# Altium footprint library PcbLib1.PcbLib: 1009 footprints (part 29 of 64)
Each footprint in its own frame and in the unit in brackets; x right, y up, seen from the top. Pads: shape width x height; smd on the part's side, far side on the other; paste and mask are expansions set on the pad; w line width, h text height; cw(c..) or ccw(c..) is an arc to the next point about the centre after c.
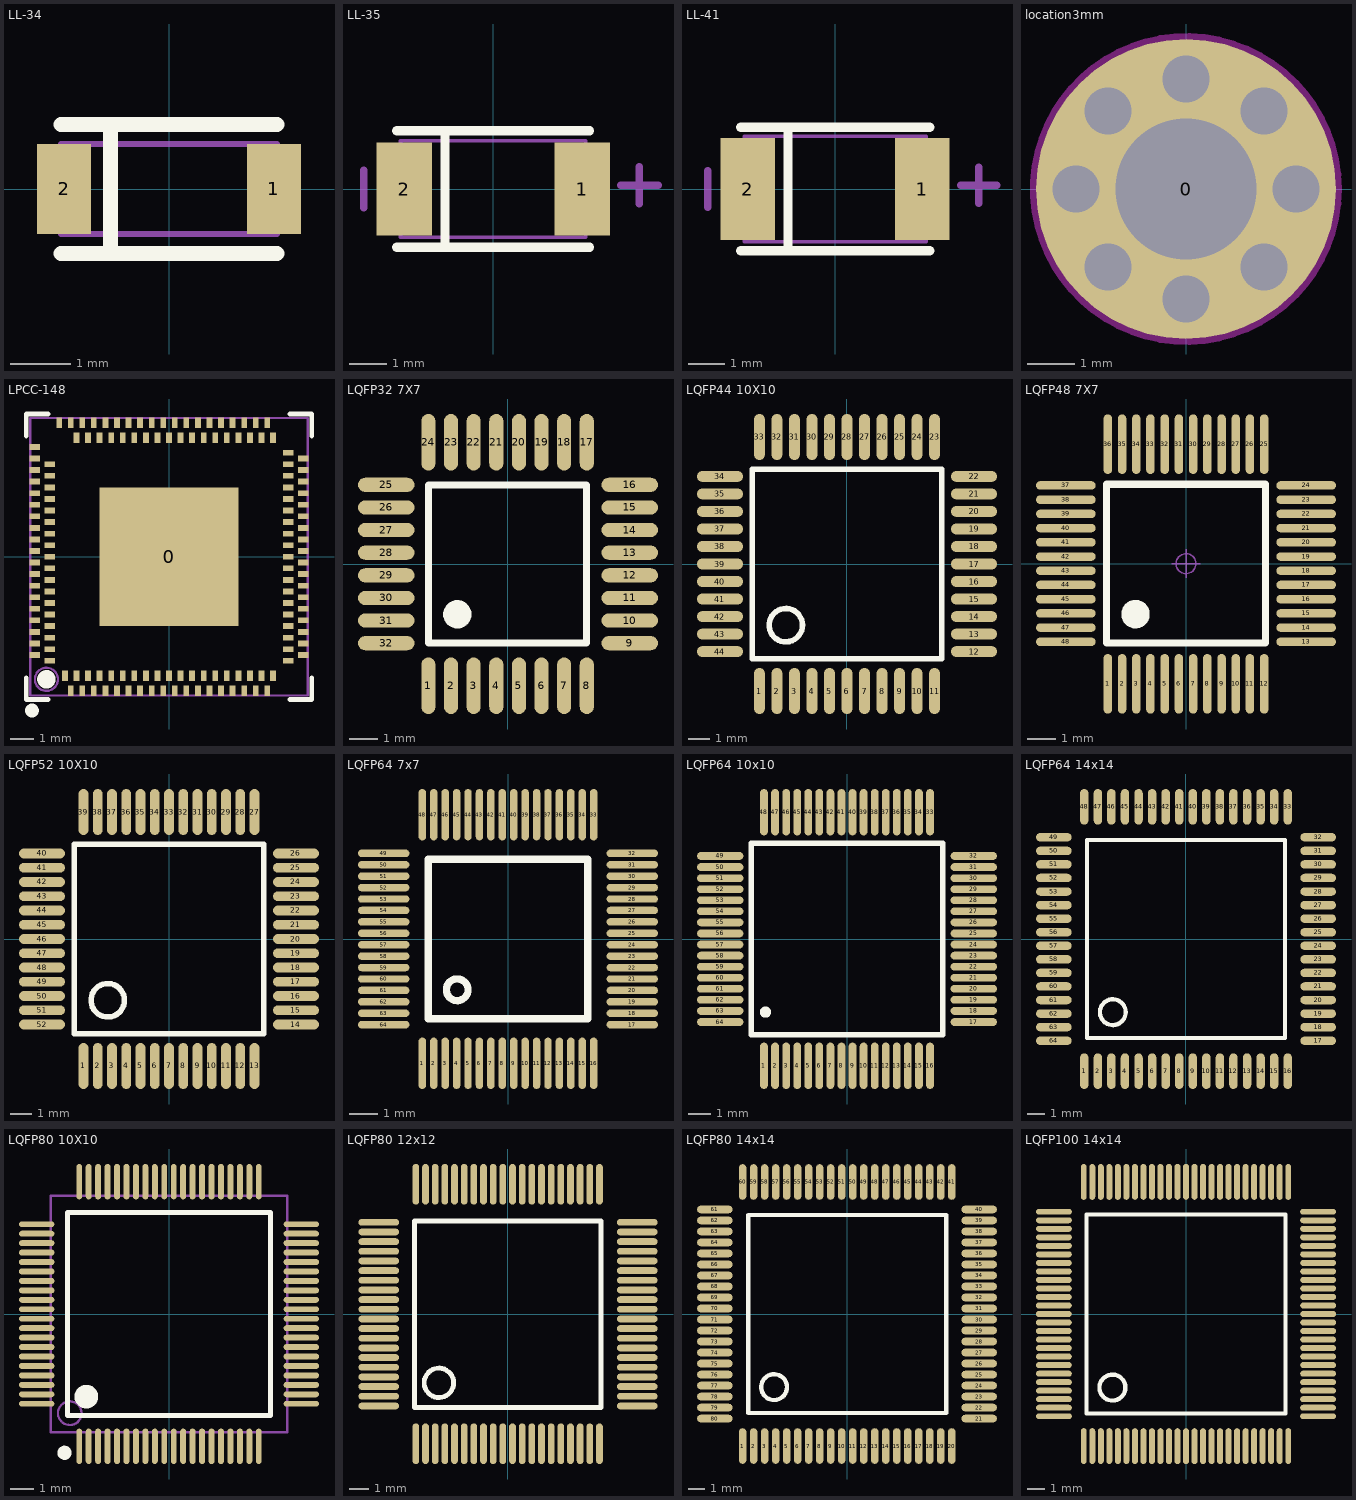
[diagram p28: the footprints below, top view; thin cyan lines are the x and y axes]

## LL-34 [mm]
pads (2):
  rect 0.9x1.5 smd: 1(1.75,0) 2(-1.75,0)
Top Overlay:
  lines w0.254: -1.8,-1.075 1.8,-1.075 ; -1.8,1.075 1.8,1.075 ; -0.975,-1.075 -0.975,1.075
Mechanical 13:
  lines w0.1: -1.8,-0.75 1.8,-0.75 1.8,0.75 -1.8,0.75 -1.8,-0.75
3D body "llds.stp": height 1.5, standoff 0, extent -1.7,-0.754 1.7,0.754

## LL-35 [mm]
pads (2):
  rect 1.5x2.5 smd: 1(2.4,0) 2(-2.4,0)
Top Overlay:
  lines w0.254: -2.6,-1.575 2.6,-1.575 ; -2.6,1.575 2.6,1.575 ; -1.3,-1.575 -1.3,1.575
Mechanical 13:
  lines w0.1: -2.5,-1.3 2.5,-1.3 2.5,1.3 -2.5,1.3 -2.5,-1.3
Mechanical 15:
  lines w0.203: -3.5,-0.5 -3.5,0.5 ; 3.45,0.1 4.45,0.1 ; 3.95,-0.4 3.95,0.6

## LL-41 [mm]
pads (2):
  rect 1.5x2.8 smd: 1(2.4,0) 2(-2.4,0)
Top Overlay:
  lines w0.254: -2.6,-1.7 2.6,-1.7 ; -2.6,1.7 2.6,1.7 ; -1.3,-1.7 -1.3,1.7
Mechanical 13:
  lines w0.1: -2.5,-1.45 -2.5,1.45 2.5,1.45 2.5,-1.45 -2.5,-1.45
Mechanical 15:
  lines w0.203: -3.5,-0.5 -3.5,0.5 ; 3.45,0.1 4.45,0.1 ; 3.95,-0.4 3.95,0.6

## location3mm [mm]
pads (1):
  round 6.4 hole 3: 0(0,0)
via 1.662,1.662 diameter 1 hole 1
via 0,2.35 diameter 1 hole 1
via -1.662,1.662 diameter 1 hole 1
via -2.35,0 diameter 1 hole 1
via -1.662,-1.662 diameter 1 hole 1
via 0,-2.35 diameter 1 hole 1
via 1.662,-1.662 diameter 1 hole 1
via 2.35,0 diameter 1 hole 1
Keep-Out Layer:
  circle w0.254: c0,0 r3.2
Mechanical 1:
  circle w0.1: c1.662,1.662 r0.508

## LPCC-148 [mm]
pads (149):
  rect 6x6 smd: 0(0,0)
  rect 0.25x0.45 smd mask+0.051: A3(-4.25,-5.8) A4(-3.75,-5.8) A5(-3.25,-5.8) A6(-2.75,-5.8) A7(-2.25,-5.8) A8(-1.75,-5.8) A9(-1.25,-5.8) A10(-0.75,-5.8) A11(-0.25,-5.8) A12(0.25,-5.8) A13(0.75,-5.8) A14(1.25,-5.8) A15(1.75,-5.8) A16(2.25,-5.8) A17(2.75,-5.8) A18(3.25,-5.8) A19(3.75,-5.8) A20(4.25,-5.8) A47(4.25,5.8) A48(3.75,5.8) A49(3.25,5.8) A50(2.75,5.8) A51(2.25,5.8) A52(1.75,5.8) A53(1.25,5.8) A54(0.75,5.8) A55(0.25,5.8) A56(-0.25,5.8) A57(-0.75,5.8) A58(-1.25,5.8) A59(-1.75,5.8) A60(-2.25,5.8) A61(-2.75,5.8) A62(-3.25,5.8) A63(-3.75,5.8) A64(-4.25,5.8) A65(-4.75,5.8) B1(-4.5,-5.15) B2(-4,-5.15) B3(-3.5,-5.15) B4(-3,-5.15) B5(-2.5,-5.15) B6(-2,-5.15) B7(-1.5,-5.15) B8(-1,-5.15) B9(-0.5,-5.15) B10(0,-5.15) B11(0.5,-5.15) B12(1,-5.15) B13(1.5,-5.15) B14(2,-5.15) B15(2.5,-5.15) B16(3,-5.15) B17(3.5,-5.15) B18(4,-5.15) B19(4.5,-5.15) B39(4.5,5.15) B40(4,5.15) B41(3.5,5.15) B42(3,5.15) B43(2.5,5.15) B44(2,5.15) B45(1.5,5.15) B46(1,5.15) B47(0.5,5.15) B48(0,5.15) B49(-0.5,5.15) B50(-1,5.15) B51(-1.5,5.15) B52(-2,5.15) B53(-2.5,5.15) B54(-3,5.15) B55(-3.5,5.15) B56(-4,5.15)
  rect 0.45x0.25 smd mask+0.051: A25(5.8,-4.25) A26(5.8,-3.75) A27(5.8,-3.25) A28(5.8,-2.75) A29(5.8,-2.25) A30(5.8,-1.75) A31(5.8,-1.25) A32(5.8,-0.75) A33(5.8,-0.25) A34(5.8,0.25) A35(5.8,0.75) A36(5.8,1.25) A37(5.8,1.75) A38(5.8,2.25) A39(5.8,2.75) A40(5.8,3.25) A41(5.8,3.75) A42(5.8,4.25) A68(-5.8,4.75) A69(-5.8,4.25) A70(-5.8,3.75) A71(-5.8,3.25) A72(-5.8,2.75) A73(-5.8,2.25) A74(-5.8,1.75) A75(-5.8,1.25) A76(-5.8,0.75) A77(-5.8,0.25) A78(-5.8,-0.25) A79(-5.8,-0.75) A80(-5.8,-1.25) A81(-5.8,-1.75) A82(-5.8,-2.25) A83(-5.8,-2.75) A84(-5.8,-3.25) A85(-5.8,-3.75) A86(-5.8,-4.25) B20(5.15,-4.5) B21(5.15,-4) B22(5.15,-3.5) B23(5.15,-3) B24(5.15,-2.5) B25(5.15,-2) B26(5.15,-1.5) B27(5.15,-1) B28(5.15,-0.5) B29(5.15,0) B30(5.15,0.5) B31(5.15,1) B32(5.15,1.5) B33(5.15,2) B34(5.15,2.5) B35(5.15,3) B36(5.15,3.5) B37(5.15,4) B38(5.15,4.5) B59(-5.15,4) B60(-5.15,3.5) B61(-5.15,3) B62(-5.15,2.5) B63(-5.15,2) B64(-5.15,1.5) B65(-5.15,1) B66(-5.15,0.5) B67(-5.15,0) B68(-5.15,-0.5) B69(-5.15,-1) B70(-5.15,-1.5) B71(-5.15,-2) B72(-5.15,-2.5) B73(-5.15,-3) B74(-5.15,-3.5) B75(-5.15,-4) B76(-5.15,-4.5)
Top Overlay:
  circle w0.4: c-5.3,-5.3 r0.2
  circle w0.3: c-5.925,-6.65 r0.15
  lines w0.2: -6.175,-5.225 -6.175,-6.175 -5.225,-6.175 ; -6.175,5.225 -6.175,6.175 -5.225,6.175 ; 5.225,-6.175 6.175,-6.175 6.175,-5.225 ; 5.225,6.175 6.175,6.175 6.175,5.225
Mechanical 13:
  circle w0.1: c-5.3,-5.3 r0.5
  lines w0.1: -6,-6 6,-6 6,6 -6,6 -6,-6

## LQFP32 7X7 [mm]
pads (32):
  oval 0.5x2 smd: 1(-2.8,-4.303) 2(-2,-4.303) 3(-1.2,-4.303) 4(-0.4,-4.303) 5(0.4,-4.303) 6(1.2,-4.303) 7(2,-4.303) 8(2.8,-4.303) 17(2.8,4.303) 18(2,4.303) 19(1.2,4.303) 20(0.4,4.303) 21(-0.4,4.303) 22(-1.2,4.303) 23(-2,4.303) 24(-2.8,4.303)
  oval 2x0.5 smd: 9(4.317,-2.8) 10(4.317,-2) 11(4.317,-1.2) 12(4.317,-0.4) 13(4.317,0.4) 14(4.317,1.2) 15(4.317,2) 16(4.317,2.8) 25(-4.289,2.8) 26(-4.289,2) 27(-4.289,1.2) 28(-4.289,0.4) 29(-4.289,-0.4) 30(-4.289,-1.2) 31(-4.289,-2) 32(-4.289,-2.8)
Top Overlay:
  circle w0.5: c-1.778,-1.778 r0.25
  lines w0.254: -2.794,-2.794 2.794,-2.794 2.794,2.794 -2.794,2.794 -2.794,-2.794
3D body "LQFP32 7X7.STEP": height 1.45, standoff 0, extent -4.51,-4.503 4.496,4.503

## LQFP44 10X10 [mm]
pads (44):
  oval 0.5x2.1 smd: 1(-4,-5.8) 2(-3.2,-5.8) 3(-2.4,-5.8) 4(-1.6,-5.8) 5(-0.8,-5.8) 6(0,-5.8) 7(0.8,-5.8) 8(1.6,-5.8) 9(2.4,-5.8) 10(3.2,-5.8) 11(4,-5.8) 23(4,5.8) 24(3.2,5.8) 25(2.4,5.8) 26(1.6,5.8) 27(0.8,5.8) 28(0,5.8) 29(-0.8,5.8) 30(-1.6,5.8) 31(-2.4,5.8) 32(-3.2,5.8) 33(-4,5.8)
  oval 2.1x0.5 smd: 12(5.8,-4) 13(5.8,-3.2) 14(5.8,-2.4) 15(5.8,-1.6) 16(5.8,-0.8) 17(5.8,0) 18(5.8,0.8) 19(5.8,1.6) 20(5.8,2.4) 21(5.8,3.2) 22(5.8,4) 34(-5.8,4) 35(-5.8,3.2) 36(-5.8,2.4) 37(-5.8,1.6) 38(-5.8,0.8) 39(-5.8,0) 40(-5.8,-0.8) 41(-5.8,-1.6) 42(-5.8,-2.4) 43(-5.8,-3.2) 44(-5.8,-4)
Top Overlay:
  circle w0.254: c-2.794,-2.794 r0.762
  lines w0.254: -4.318,-4.318 4.318,-4.318 4.318,4.318 -4.318,4.318 -4.318,-4.318
3D body "LQFP44 10X10.STEP": height 1.45, standoff 0, extent -5.986,-6.003 6.02,6.003

## LQFP48 7X7 [mm]
pads (48):
  oval 0.3x2.1 smd: 1(-2.75,-4.227) 2(-2.25,-4.227) 3(-1.75,-4.227) 4(-1.25,-4.227) 5(-0.75,-4.227) 6(-0.25,-4.227) 7(0.25,-4.227) 8(0.75,-4.227) 9(1.25,-4.227) 10(1.75,-4.227) 11(2.25,-4.227) 12(2.75,-4.227) 25(2.75,4.202) 26(2.25,4.202) 27(1.75,4.202) 28(1.25,4.202) 29(0.75,4.202) 30(0.25,4.202) 31(-0.25,4.202) 32(-0.75,4.202) 33(-1.25,4.202) 34(-1.75,4.202) 35(-2.25,4.202) 36(-2.75,4.202)
  oval 2.1x0.3 smd: 13(4.227,-2.75) 14(4.227,-2.25) 15(4.227,-1.75) 16(4.227,-1.25) 17(4.227,-0.75) 18(4.227,-0.25) 19(4.227,0.25) 20(4.227,0.75) 21(4.227,1.25) 22(4.227,1.75) 23(4.227,2.25) 24(4.227,2.75) 37(-4.227,2.75) 38(-4.227,2.25) 39(-4.227,1.75) 40(-4.227,1.25) 41(-4.227,0.75) 42(-4.227,0.25) 43(-4.227,-0.25) 44(-4.227,-0.75) 45(-4.227,-1.25) 46(-4.227,-1.75) 47(-4.227,-2.25) 48(-4.227,-2.75)
Top Overlay:
  circle w0.5: c-1.778,-1.778 r0.25
  lines w0.254: -2.794,-2.794 -2.794,2.794 2.794,2.794 2.794,-2.794 -2.794,-2.794
Mechanical 15:
  circle w0.05: c0,0 r0.35
  lines w0.05: -0.5,0 0.5,0 ; 0,-0.5 0,0.5
3D body "LQFP48 7X7.STEP": height 1.45, standoff 0, extent -4.51,-4.503 4.496,4.503

## LQFP52 10X10 [mm]
pads (52):
  oval 0.45x2.1 smd: 1(-3.9,-5.791) 2(-3.25,-5.791) 3(-2.6,-5.791) 4(-1.95,-5.791) 5(-1.3,-5.791) 6(-0.65,-5.791) 7(0,-5.791) 8(0.65,-5.791) 9(1.3,-5.791) 10(1.95,-5.791) 11(2.6,-5.791) 12(3.25,-5.791) 13(3.9,-5.791) 27(3.9,5.791) 28(3.25,5.791) 29(2.6,5.791) 30(1.95,5.791) 31(1.3,5.791) 32(0.65,5.791) 33(0,5.791) 34(-0.65,5.791) 35(-1.3,5.791) 36(-1.95,5.791) 37(-2.6,5.791) 38(-3.25,5.791) 39(-3.9,5.791)
  oval 2.1x0.45 smd: 14(5.791,-3.9) 15(5.791,-3.25) 16(5.791,-2.6) 17(5.791,-1.95) 18(5.791,-1.3) 19(5.791,-0.65) 20(5.791,0) 21(5.791,0.65) 22(5.791,1.3) 23(5.791,1.95) 24(5.791,2.6) 25(5.791,3.25) 26(5.791,3.9) 40(-5.791,3.9) 41(-5.791,3.25) 42(-5.791,2.6) 43(-5.791,1.95) 44(-5.791,1.3) 45(-5.791,0.65) 46(-5.791,0) 47(-5.791,-0.65) 48(-5.791,-1.3) 49(-5.791,-1.95) 50(-5.791,-2.6) 51(-5.791,-3.25) 52(-5.791,-3.9)
Top Overlay:
  circle w0.254: c-2.794,-2.794 r0.762
  lines w0.254: -4.318,-4.318 4.318,-4.318 4.318,4.318 -4.318,4.318 -4.318,-4.318
3D body "LQFP52 10X10.STEP": height 1.45, standoff 0, extent -5.986,-6.028 6.02,5.977

## LQFP64 7x7 [mm]
pads (64):
  oval 0.26x1.8 smd: 1(-3,-4.352) 2(-2.6,-4.352) 3(-2.2,-4.352) 4(-1.8,-4.352) 5(-1.4,-4.352) 6(-1,-4.352) 7(-0.6,-4.352) 8(-0.2,-4.352) 9(0.2,-4.352) 10(0.6,-4.352) 11(1,-4.352) 12(1.4,-4.352) 13(1.8,-4.352) 14(2.2,-4.352) 15(2.6,-4.352) 16(3,-4.352) 33(3,4.352) 34(2.6,4.352) 35(2.2,4.352) 36(1.8,4.352) 37(1.4,4.352) 38(1,4.352) 39(0.6,4.352) 40(0.2,4.352) 41(-0.2,4.352) 42(-0.6,4.352) 43(-1,4.352) 44(-1.4,4.352) 45(-1.8,4.352) 46(-2.2,4.352) 47(-2.6,4.352) 48(-3,4.352)
  oval 1.8x0.26 smd: 17(4.352,-3) 18(4.352,-2.6) 19(4.352,-2.2) 20(4.352,-1.8) 21(4.352,-1.4) 22(4.352,-1) 23(4.352,-0.6) 24(4.352,-0.2) 25(4.352,0.2) 26(4.352,0.6) 27(4.352,1) 28(4.352,1.4) 29(4.352,1.8) 30(4.352,2.2) 31(4.352,2.6) 32(4.352,3) 49(-4.352,3) 50(-4.352,2.6) 51(-4.352,2.2) 52(-4.352,1.8) 53(-4.352,1.4) 54(-4.352,1) 55(-4.352,0.6) 56(-4.352,0.2) 57(-4.352,-0.2) 58(-4.352,-0.6) 59(-4.352,-1) 60(-4.352,-1.4) 61(-4.352,-1.8) 62(-4.352,-2.2) 63(-4.352,-2.6) 64(-4.352,-3)
Top Overlay:
  circle w0.254: c-1.778,-1.778 r0.381
  lines w0.254: -2.794,-2.794 -2.794,2.794 2.794,2.794 2.794,-2.794 -2.794,-2.794
3D body "LQFP64 7x7.STEP": height 1.45, standoff 0, extent -4.51,-4.503 4.496,4.503

## LQFP64 10x10 [mm]
pads (64):
  oval 0.35x2.1 smd: 1(-3.75,-5.727) 2(-3.25,-5.727) 3(-2.75,-5.727) 4(-2.25,-5.727) 5(-1.75,-5.727) 6(-1.25,-5.727) 7(-0.75,-5.727) 8(-0.25,-5.727) 9(0.25,-5.727) 10(0.75,-5.727) 11(1.25,-5.727) 12(1.75,-5.727) 13(2.25,-5.727) 14(2.75,-5.727) 15(3.25,-5.727) 16(3.75,-5.727) 33(3.75,5.727) 34(3.25,5.727) 35(2.75,5.727) 36(2.25,5.727) 37(1.75,5.727) 38(1.25,5.727) 39(0.75,5.727) 40(0.25,5.727) 41(-0.25,5.727) 42(-0.75,5.727) 43(-1.25,5.727) 44(-1.75,5.727) 45(-2.25,5.727) 46(-2.75,5.727) 47(-3.25,5.727) 48(-3.75,5.727)
  oval 2.1x0.35 smd: 17(5.727,-3.75) 18(5.727,-3.25) 19(5.727,-2.75) 20(5.727,-2.25) 21(5.727,-1.75) 22(5.727,-1.25) 23(5.727,-0.75) 24(5.727,-0.25) 25(5.727,0.25) 26(5.727,0.75) 27(5.727,1.25) 28(5.727,1.75) 29(5.727,2.25) 30(5.727,2.75) 31(5.727,3.25) 32(5.727,3.75) 49(-5.727,3.75) 50(-5.727,3.25) 51(-5.727,2.75) 52(-5.727,2.25) 53(-5.727,1.75) 54(-5.727,1.25) 55(-5.727,0.75) 56(-5.727,0.25) 57(-5.727,-0.25) 58(-5.727,-0.75) 59(-5.727,-1.25) 60(-5.727,-1.75) 61(-5.727,-2.25) 62(-5.727,-2.75) 63(-5.727,-3.25) 64(-5.727,-3.75)
Top Overlay:
  circle w0.254: c-3.683,-3.302 r0.127
  lines w0.254: -4.318,-4.318 -4.318,4.318 4.318,4.318 4.318,-4.318 -4.318,-4.318
3D body "LQFP64 10x10.STEP": height 1.45, standoff 0, extent -6.003,-5.986 6.003,6.02

## LQFP64 14x14 [mm]
pads (64):
  oval 0.5x2.1 smd: 1(-6,-7.799) 2(-5.2,-7.799) 3(-4.4,-7.799) 4(-3.6,-7.799) 5(-2.8,-7.799) 6(-2,-7.799) 7(-1.2,-7.799) 8(-0.4,-7.799) 9(0.4,-7.799) 10(1.2,-7.799) 11(2,-7.799) 12(2.8,-7.799) 13(3.6,-7.799) 14(4.4,-7.799) 15(5.2,-7.799) 16(6,-7.799) 33(6,7.799) 34(5.2,7.799) 35(4.4,7.799) 36(3.6,7.799) 37(2.8,7.799) 38(2,7.799) 39(1.2,7.799) 40(0.4,7.799) 41(-0.4,7.799) 42(-1.2,7.799) 43(-2,7.799) 44(-2.8,7.799) 45(-3.6,7.799) 46(-4.4,7.799) 47(-5.2,7.799) 48(-6,7.799)
  oval 2.1x0.5 smd: 17(7.799,-6) 18(7.799,-5.2) 19(7.799,-4.4) 20(7.799,-3.6) 21(7.799,-2.8) 22(7.799,-2) 23(7.799,-1.2) 24(7.799,-0.4) 25(7.799,0.4) 26(7.799,1.2) 27(7.799,2) 28(7.799,2.8) 29(7.799,3.6) 30(7.799,4.4) 31(7.799,5.2) 32(7.799,6) 49(-7.799,6) 50(-7.799,5.2) 51(-7.799,4.4) 52(-7.799,3.6) 53(-7.799,2.8) 54(-7.799,2) 55(-7.799,1.2) 56(-7.799,0.4) 57(-7.799,-0.4) 58(-7.799,-1.2) 59(-7.799,-2) 60(-7.799,-2.8) 61(-7.799,-3.6) 62(-7.799,-4.4) 63(-7.799,-5.2) 64(-7.799,-6)
Top Overlay:
  circle w0.254: c-4.318,-4.318 r0.762
  lines w0.254: -5.842,-5.842 -5.842,5.842 5.842,5.842 5.842,-5.842 -5.842,-5.842
3D body "LQFP64 14x14.STEP": height 1.45, standoff 0, extent -8.005,-8.03 8.001,7.976

## LQFP80 10X10 [mm]
pads (80):
  oval 0.25x1.5 smd mask+0.051: 1(-3.8,-5.6) 2(-3.4,-5.6) 3(-3,-5.6) 4(-2.6,-5.6) 5(-2.2,-5.6) 6(-1.8,-5.6) 7(-1.4,-5.6) 8(-1,-5.6) 9(-0.6,-5.6) 10(-0.2,-5.6) 11(0.2,-5.6) 12(0.6,-5.6) 13(1,-5.6) 14(1.4,-5.6) 15(1.8,-5.6) 16(2.2,-5.6) 17(2.6,-5.6) 18(3,-5.6) 19(3.4,-5.6) 20(3.8,-5.6) 41(3.8,5.6) 42(3.4,5.6) 43(3,5.6) 44(2.6,5.6) 45(2.2,5.6) 46(1.8,5.6) 47(1.4,5.6) 48(1,5.6) 49(0.6,5.6) 50(0.2,5.6) 51(-0.2,5.6) 52(-0.6,5.6) 53(-1,5.6) 54(-1.4,5.6) 55(-1.8,5.6) 56(-2.2,5.6) 57(-2.6,5.6) 58(-3,5.6) 59(-3.4,5.6) 60(-3.8,5.6)
  oval 1.5x0.25 smd mask+0.051: 21(5.6,-3.8) 22(5.6,-3.4) 23(5.6,-3) 24(5.6,-2.6) 25(5.6,-2.2) 26(5.6,-1.8) 27(5.6,-1.4) 28(5.6,-1) 29(5.6,-0.6) 30(5.6,-0.2) 31(5.6,0.2) 32(5.6,0.6) 33(5.6,1) 34(5.6,1.4) 35(5.6,1.8) 36(5.6,2.2) 37(5.6,2.6) 38(5.6,3) 39(5.6,3.4) 40(5.6,3.8) 61(-5.6,3.8) 62(-5.6,3.4) 63(-5.6,3) 64(-5.6,2.6) 65(-5.6,2.2) 66(-5.6,1.8) 67(-5.6,1.4) 68(-5.6,1) 69(-5.6,0.6) 70(-5.6,0.2) 71(-5.6,-0.2) 72(-5.6,-0.6) 73(-5.6,-1) 74(-5.6,-1.4) 75(-5.6,-1.8) 76(-5.6,-2.2) 77(-5.6,-2.6) 78(-5.6,-3) 79(-5.6,-3.4) 80(-5.6,-3.8)
Top Overlay:
  circle w0.3: c-4.425,-5.875 r0.15
  circle w0.5: c-3.5,-3.5 r0.25
  lines w0.2: -4.3,-4.3 4.3,-4.3 4.3,4.3 -4.3,4.3 -4.3,-4.3
Mechanical 13:
  circle w0.1: c-4.2,-4.2 r0.5
  lines w0.1: -5,-5 5,-5 5,5 -5,5 -5,-5

## LQFP80 12x12 [mm]
pads (80):
  oval 0.35x2.1 smd: 1(-4.75,-6.706) 2(-4.25,-6.706) 3(-3.75,-6.706) 4(-3.25,-6.706) 5(-2.75,-6.706) 6(-2.25,-6.706) 7(-1.75,-6.706) 8(-1.25,-6.706) 9(-0.75,-6.706) 10(-0.25,-6.706) 11(0.25,-6.706) 12(0.75,-6.706) 13(1.25,-6.706) 14(1.75,-6.706) 15(2.25,-6.706) 16(2.75,-6.706) 17(3.25,-6.706) 18(3.75,-6.706) 19(4.25,-6.706) 20(4.75,-6.706) 41(4.75,6.717) 42(4.25,6.717) 43(3.75,6.717) 44(3.25,6.717) 45(2.75,6.717) 46(2.25,6.717) 47(1.75,6.717) 48(1.25,6.717) 49(0.75,6.717) 50(0.25,6.717) 51(-0.25,6.717) 52(-0.75,6.717) 53(-1.25,6.717) 54(-1.75,6.717) 55(-2.25,6.717) 56(-2.75,6.717) 57(-3.25,6.717) 58(-3.75,6.717) 59(-4.25,6.717) 60(-4.75,6.717)
  oval 2.1x0.35 smd: 21(6.706,-4.75) 22(6.706,-4.25) 23(6.706,-3.75) 24(6.706,-3.25) 25(6.706,-2.75) 26(6.706,-2.25) 27(6.706,-1.75) 28(6.706,-1.25) 29(6.706,-0.75) 30(6.706,-0.25) 31(6.706,0.25) 32(6.706,0.75) 33(6.706,1.25) 34(6.706,1.75) 35(6.706,2.25) 36(6.706,2.75) 37(6.706,3.25) 38(6.706,3.75) 39(6.706,4.25) 40(6.706,4.75) 61(-6.67,4.75) 62(-6.67,4.25) 63(-6.67,3.75) 64(-6.67,3.25) 65(-6.67,2.75) 66(-6.67,2.25) 67(-6.67,1.75) 68(-6.67,1.25) 69(-6.67,0.75) 70(-6.67,0.25) 71(-6.67,-0.25) 72(-6.67,-0.75) 73(-6.67,-1.25) 74(-6.67,-1.75) 75(-6.67,-2.25) 76(-6.67,-2.75) 77(-6.67,-3.25) 78(-6.67,-3.75) 79(-6.67,-4.25) 80(-6.67,-4.75)
Top Overlay:
  circle w0.254: c-3.556,-3.556 r0.762
  lines w0.254: -4.826,-4.826 4.826,-4.826 4.826,4.826 -4.826,4.826 -4.826,-4.826
3D body "LQFP80 12x12.STEP": height 1.45, standoff 0, extent -7.003,-6.995 7.003,7.01

## LQFP80 14x14 [mm]
pads (80):
  oval 0.45x2.1 smd: 1(-6.175,-7.797) 2(-5.525,-7.797) 3(-4.875,-7.797) 4(-4.225,-7.797) 5(-3.575,-7.797) 6(-2.925,-7.797) 7(-2.275,-7.797) 8(-1.625,-7.797) 9(-0.975,-7.797) 10(-0.325,-7.797) 11(0.325,-7.797) 12(0.975,-7.797) 13(1.625,-7.797) 14(2.275,-7.797) 15(2.925,-7.797) 16(3.575,-7.797) 17(4.225,-7.797) 18(4.875,-7.797) 19(5.525,-7.797) 20(6.175,-7.797) 41(6.175,7.797) 42(5.525,7.797) 43(4.875,7.797) 44(4.225,7.797) 45(3.575,7.797) 46(2.925,7.797) 47(2.275,7.797) 48(1.625,7.797) 49(0.975,7.797) 50(0.325,7.797) 51(-0.325,7.797) 52(-0.975,7.797) 53(-1.625,7.797) 54(-2.275,7.797) 55(-2.925,7.797) 56(-3.575,7.797) 57(-4.225,7.797) 58(-4.875,7.797) 59(-5.525,7.797) 60(-6.175,7.797)
  oval 2.1x0.45 smd: 21(7.797,-6.175) 22(7.797,-5.525) 23(7.797,-4.875) 24(7.797,-4.225) 25(7.797,-3.575) 26(7.797,-2.925) 27(7.797,-2.275) 28(7.797,-1.625) 29(7.797,-0.975) 30(7.797,-0.325) 31(7.797,0.325) 32(7.797,0.975) 33(7.797,1.625) 34(7.797,2.275) 35(7.797,2.925) 36(7.797,3.575) 37(7.797,4.225) 38(7.797,4.875) 39(7.797,5.525) 40(7.797,6.175) 61(-7.822,6.175) 62(-7.822,5.525) 63(-7.822,4.875) 64(-7.822,4.225) 65(-7.822,3.575) 66(-7.822,2.925) 67(-7.822,2.275) 68(-7.822,1.625) 69(-7.822,0.975) 70(-7.822,0.325) 71(-7.822,-0.325) 72(-7.822,-0.975) 73(-7.822,-1.625) 74(-7.822,-2.275) 75(-7.822,-2.925) 76(-7.822,-3.575) 77(-7.822,-4.225) 78(-7.822,-4.875) 79(-7.822,-5.525) 80(-7.822,-6.175)
Top Overlay:
  circle w0.254: c-4.318,-4.318 r0.762
  lines w0.254: -5.842,-5.842 -5.842,5.842 5.842,5.842 5.842,-5.842 -5.842,-5.842
3D body "LQFP80 14x14.STEP": height 1.45, standoff 0, extent -8.001,-8.005 8.005,8.001

## LQFP100 14x14 [mm]
pads (100):
  oval 0.35x2.1 smd: 1(-6,-7.747) 2(-5.5,-7.747) 3(-5,-7.747) 4(-4.5,-7.747) 5(-4,-7.747) 6(-3.5,-7.747) 7(-3,-7.747) 8(-2.5,-7.747) 9(-2,-7.747) 10(-1.5,-7.747) 11(-1,-7.747) 12(-0.5,-7.747) 13(0,-7.747) 14(0.5,-7.747) 15(1,-7.747) 16(1.5,-7.747) 17(2,-7.747) 18(2.5,-7.747) 19(3,-7.747) 20(3.5,-7.747) 21(4,-7.747) 22(4.5,-7.747) 23(5,-7.747) 24(5.5,-7.747) 25(6,-7.747) 51(6,7.758) 52(5.5,7.758) 53(5,7.758) 54(4.5,7.758) 55(4,7.758) 56(3.5,7.758) 57(3,7.758) 58(2.5,7.758) 59(2,7.758) 60(1.5,7.758) 61(1,7.758) 62(0.5,7.758) 63(0,7.758) 64(-0.5,7.758) 65(-1,7.758) 66(-1.5,7.758) 67(-2,7.758) 68(-2.5,7.758) 69(-3,7.758) 70(-3.5,7.758) 71(-4,7.758) 72(-4.5,7.758) 73(-5,7.758) 74(-5.5,7.758) 75(-6,7.758)
  oval 2.1x0.35 smd: 26(7.752,-5.994) 27(7.752,-5.494) 28(7.752,-4.994) 29(7.752,-4.494) 30(7.752,-3.994) 31(7.752,-3.494) 32(7.752,-2.994) 33(7.752,-2.494) 34(7.752,-1.994) 35(7.752,-1.494) 36(7.752,-0.994) 37(7.752,-0.494) 38(7.752,0.006) 39(7.752,0.506) 40(7.752,1.006) 41(7.752,1.506) 42(7.752,2.006) 43(7.752,2.506) 44(7.752,3.006) 45(7.752,3.506) 46(7.752,4.006) 47(7.752,4.506) 48(7.752,5.006) 49(7.752,5.506) 50(7.752,6.006) 76(-7.752,6.006) 77(-7.752,5.506) 78(-7.752,5.006) 79(-7.752,4.506) 80(-7.752,4.006) 81(-7.752,3.506) 82(-7.752,3.006) 83(-7.752,2.506) 84(-7.752,2.006) 85(-7.752,1.506) 86(-7.752,1.006) 87(-7.752,0.506) 88(-7.752,0.006) 89(-7.752,-0.494) 90(-7.752,-0.994) 91(-7.752,-1.494) 92(-7.752,-1.994) 93(-7.752,-2.494) 94(-7.752,-2.994) 95(-7.752,-3.494) 96(-7.752,-3.994) 97(-7.752,-4.494) 98(-7.752,-4.994) 99(-7.752,-5.494) 100(-7.752,-5.994)
Top Overlay:
  circle w0.254: c-4.318,-4.312 r0.762
  lines w0.254: -5.842,-5.836 -5.842,5.848 5.842,5.848 5.842,-5.836 -5.842,-5.836
3D body "LQFP100 14x14.STEP": height 1.45, standoff 0, extent -8.001,-7.979 8.005,8.026